# Altium footprint library TinyShuffle v.0.PcbLib: 44 footprints (part 3 of 3)
Each footprint in its own frame and in the unit in brackets; x right, y up, seen from the top. Pads: shape width x height; smd on the part's side, far side on the other; paste and mask are expansions set on the pad; w line width, h text height; cw(c..) or ccw(c..) is an arc to the next point about the centre after c.
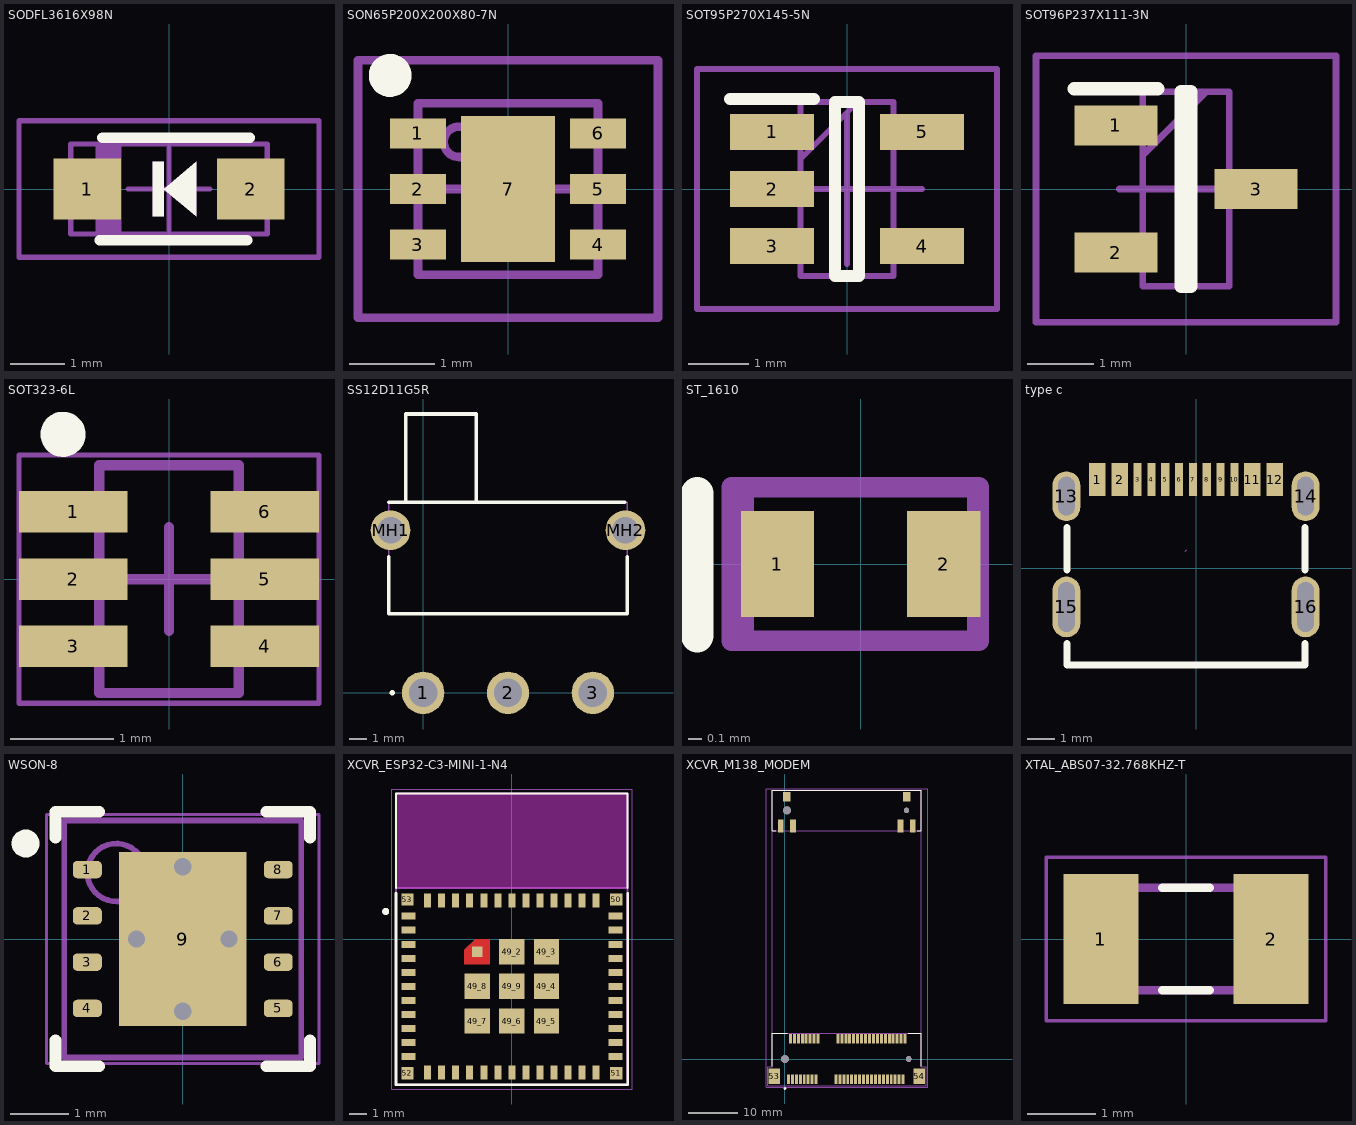
[diagram p2: the footprints below, top view; thin cyan lines are the x and y axes]

## SODFL3616X98N [mm]
pads (2):
  rect 1.24x1.12 smd: 1(-1.5,0) 2(1.5,0)
Top Overlay:
  region: -0.3,0 -0.3,0.5 -0.1,0.5 -0.1,0
  region: -0.1,0 0.5,0.5 0.5,0
  region: -0.3,0 -0.3,-0.5 -0.1,-0.5 -0.1,0
  region: -0.1,0 0.5,-0.5 0.5,0
  lines w0.2: -1.27,-0.94 1.43,-0.94 ; -1.219,0.94 1.481,0.94
Top Component Outline:
  rectangle: -1.35,-0.825 -0.875,0.825
  region: -0.3,0 -0.3,0.5 -0.1,0.5 -0.1,0
  region: -0.1,0 0.5,0.5 0.5,0
  region: -0.3,0 -0.3,-0.5 -0.1,-0.5 -0.1,0
  region: -0.1,0 0.5,-0.5 0.5,0
  lines w0.1: -1.8,-0.825 1.8,-0.825 1.8,0.825 -1.8,0.825 -1.8,-0.825
Top Courtyard:
  lines w0.1: -0.75,0 0,0 ; 0,-0.75 0,0 ; 0,0.75 0,0 ; 0.75,0 0,0 ; -2.75,-1.25 -2.75,1.25 2.75,1.25 2.75,-1.25 0,-1.25 -2.75,-1.25
3D body "NRVB120VLSFT1G.stp": height 0.98, standoff 0, extent -1.8,-0.825 1.8,0.825

## SON65P200X200X80-7N [mm]
pads (7):
  rect 0.65x0.35 smd mask+0.05: 1(-1.05,0.65) 2(-1.05,0) 3(-1.05,-0.65) 4(1.05,-0.65) 5(1.05,0) 6(1.05,0.65)
  rect 1.1x1.7 smd mask+0: 7(0,0)
Top Overlay:
  circle w0.25: c-1.375,1.325 r0.125
Top Component Outline:
  circle w0.1: c-0.573,0.55 r0.177
  lines w0.1: -1.05,-1 1.05,-1 1.05,1 -1.05,1 -1.05,-1
Top Courtyard:
  lines w0.1: -0.75,0 0,0 ; 0,-0.75 0,0 ; 0,0.75 0,0 ; 0.75,0 0,0 ; -1.75,-1.5 0,-1.5 1.75,-1.5 1.75,0 1.75,1.5 0,1.5 -1.75,1.5 -1.75,0 -1.75,-1.5
3D body "NCV8187AMT330TAG.stp": height 0.8, standoff 0, extent -1.05,-1 1.05,1

## SOT95P270X145-5N [mm]
pads (5):
  rect 1.4x0.6 smd paste-0.05: 1(-1.25,0.95) 2(-1.25,0) 3(-1.25,-0.95) 4(1.25,-0.95) 5(1.25,0.95)
Top Overlay:
  lines w0.2: -1.95,1.5 -0.55,1.5 ; -0.2,-1.45 0.2,-1.45 0.2,1.45 -0.2,1.45 -0.2,-1.45
Top Component Outline:
  lines w0.1: -0.775,0.5 0.175,1.45 ; -0.775,-1.45 0.775,-1.45 0.775,1.45 -0.775,1.45 -0.775,-1.45
Top Courtyard:
  lines w0.1: -1.25,0 0,0 ; 0,-1.25 0,0 ; 0,1.25 0,0 ; 1.25,0 0,0 ; -2.5,-2 0,-2 2.5,-2 2.5,0 2.5,2 0,2 -2.5,2 -2.5,0 -2.5,-2
3D body "MCP73831T-2ACI_OT.stp": height 1.45, standoff 0, extent -1.35,-1.45 1.35,1.45

## SOT96P237X111-3N [mm]
pads (3):
  rect 1.25x0.6 smd paste-0.05: 1(-1.05,0.955) 2(-1.05,-0.955) 3(1.05,0)
Top Overlay:
  lines w0.2: -1.675,1.505 -0.425,1.505 ; -0.075,-1.46 0.075,-1.46 0.075,1.46 -0.075,1.46 -0.075,-1.46
Top Component Outline:
  lines w0.1: -0.65,0.505 0.305,1.46 ; -0.65,-1.46 0.65,-1.46 0.65,1.46 -0.65,1.46 -0.65,-1.46
Top Courtyard:
  lines w0.1: -1,0 0,0 ; 0,-1 0,0 ; 0,1 0,0 ; 1,0 0,0 ; -2.25,-2 0,-2 2.25,-2 2.25,0 2.25,2 0,2 -2.25,2 -2.25,0 -2.25,-2
3D body "MMBT2222ALT1G.stp": height 1.11, standoff 0, extent -1.185,-1.46 1.185,1.46

## SOT323-6L [mm] "SOT23, 6-Leads, Body 2,00x2,10mm, Pitch 0,65mm, IPC High Density"
height 1.1
pads (6):
  rect 1.05x0.4 smd paste-0.03 mask+0.05: 1(-0.925,0.65) 2(-0.925,0) 3(-0.925,-0.65) 4(0.925,-0.65) 5(0.925,0) 6(0.925,0.65)
Top Overlay:
  circle w0.25: c-1.025,1.4 r0.093
Mechanical 11:
  lines w0.1: -0.675,-1.1 0.675,-1.1 0.675,1.1 -0.675,1.1 -0.675,-1.1
Top Courtyard:
  lines w0.05: -1.45,-1.2 1.45,-1.2 1.45,1.2 -1.45,1.2 -1.45,-1.2
  lines w0.1: -0.5,0 0.5,0 ; 0,-0.5 0,0.5
3D body: height 1.1, standoff 0.1, extent -0.675,-1.1 0.675,1.1

## SS12D11G5R [mm]
pads (5):
  round 2.4 hole 1.6: 1(0,0) 2(4.8,0) 3(9.6,0)
  round 2.25 hole 1.5: MH1(-1.85,9.2) MH2(11.45,9.2)
Top Overlay:
  lines w0.2: -1.95,7.7 -1.95,4.48 11.55,4.48 11.55,7.7 ; -1.95,10.78 11.4,10.78 ; -1.8,0 ccw(c-1.75,0) -1.7,0 ; -1.8,0 cw(c-1.75,0) -1.7,0 ; -1.8,0 ccw(c-1.75,0) -1.7,0 ; -1,10.78 -1,15.78 3,15.78 3,10.78 -1,10.78
Top Component Outline:
  lines w0.1: -1.95,4.48 -1.95,10.78 11.55,10.78 11.55,4.48 -1.95,4.48

## ST_1610 [mm]
height 0.6
pads (2):
  rect 0.55x0.8 smd paste-0.05 mask+0.05: 1(-0.625,0) 2(0.625,0)
Top Overlay:
  lines w0.25: -1.23,-0.54 -1.23,0.53
Top Assembly:
  lines w0.15: -0.97,-0.58 -0.97,0.58 0.89,0.58 0.89,-0.58 -0.97,-0.58
  text "'.Designator'" at -1.14,0.968 h1
Top Component Outline:
  lines w0.1: -0.85,-0.55 0.85,-0.55 0.85,0.55 -0.85,0.55 -0.85,-0.55
3D body "ZDO_1610_STM.step": height 0.66, standoff 0, extent -0.851,-0.546 0.851,0.546

## type c [mm]
pads (16):
  rect 0.6x1.2 smd: 1(-3.579,3.203) 2(-2.779,3.203) 11(2.021,3.203) 12(2.821,3.203)
  rect 0.3x1.2 smd: 3(-2.129,3.203) 4(-1.629,3.203) 5(-1.129,3.203) 6(-0.629,3.203) 7(-0.129,3.203) 8(0.371,3.203) 9(0.871,3.203) 10(1.371,3.203)
  oval 1x1.8 hole 0.6 slot 1.4 at 90 deg: 13(-4.699,2.603) 14(3.941,2.603)
  oval 1x2.2 hole 0.6 slot 1.8 at 90 deg: 15(-4.699,-1.397) 16(3.941,-1.397)
Top Overlay:
  lines w0.254: -4.679,-2.728 -4.679,-3.497 3.921,-3.497 3.921,-2.728 ; -4.679,-0.066 -4.679,1.472 ; 3.921,-0.066 3.921,1.472
Top Courtyard:
  lines w0.003: -0.404,0.621 -0.354,0.672

## WSON-8 [mm] "SON, 8-Leads, Body 4,00x4,00mm, Pitch 0,80mm, Thermal Pad 2,20x2,29mm, IPC High Density"
height 0.8
pads (9):
  rrect50% 0.5x0.3 smd: 1(-1.65,1.2) 2(-1.65,0.4) 3(-1.65,-0.4) 4(-1.65,-1.2) 5(1.65,-1.2) 6(1.65,-0.4) 7(1.65,0.4) 8(1.65,1.2)
  rect 2.2x3 smd paste-3: 9(0,0)
via -0.8,0 diameter 0.5 hole 0.3
via 0.8,0 diameter 0.5 hole 0.3
via 0,1.25 diameter 0.5 hole 0.3
via 0,-1.25 diameter 0.5 hole 0.3
Top Overlay:
  circle w0.254: c-2.718,1.651 r0.114
  lines w0.2: -2.2,-1.75 -2.2,-2.2 -1.445,-2.2 ; -2.2,1.75 -2.2,2.2 -1.445,2.2 ; 1.445,-2.2 2.2,-2.2 2.2,-1.75 ; 1.445,2.2 2.2,2.2 2.2,1.75
Top Paste:
  rectangle: -1.08,0.1 -0.1,1.41
  rectangle: 0.1,0.1 1.08,1.41
  rectangle: -1.08,-1.41 -0.1,-0.1
  rectangle: 0.1,-1.41 1.08,-0.1
Mechanical 12:
  circle w0.1: c-1.15,1.15 r0.5
  lines w0.1: -2.05,-2.05 -2.05,2.05 2.05,2.05 2.05,-2.05 -2.05,-2.05
Top Courtyard:
  lines w0.05: -2.355,-2.15 -2.355,2.15 2.355,2.15 2.355,-2.15 -2.355,-2.15
  lines w0.1: -0.5,0 0.5,0 ; 0,-0.5 0,0.5
3D body: height 0.8, standoff 0.1, extent -2.05,-2.05 2.05,2.05

## XCVR_ESP32-C3-MINI-1-N4 [mm]
pads (61):
  rect 0.8x0.4 smd: 1(-5.9,1.3) 2(-5.9,0.5) 3(-5.9,-0.3) 4(-5.9,-1.1) 5(-5.9,-1.9) 6(-5.9,-2.7) 7(-5.9,-3.5) 8(-5.9,-4.3) 9(-5.9,-5.1) 10(-5.9,-5.9) 11(-5.9,-6.7) 25(5.9,-6.7) 26(5.9,-5.9) 27(5.9,-5.1) 28(5.9,-4.3) 29(5.9,-3.5) 30(5.9,-2.7) 31(5.9,-1.9) 32(5.9,-1.1) 33(5.9,-0.3) 34(5.9,0.5) 35(5.9,1.3)
  rect 0.4x0.8 smd: 12(-4.8,-7.6) 13(-4,-7.6) 14(-3.2,-7.6) 15(-2.4,-7.6) 16(-1.6,-7.6) 17(-0.8,-7.6) 18(0,-7.6) 19(0.8,-7.6) 20(1.6,-7.6) 21(2.4,-7.6) 22(3.2,-7.6) 23(4,-7.6) 24(4.8,-7.6) 36(4.8,2.2) 37(4,2.2) 38(3.2,2.2) 39(2.4,2.2) 40(1.6,2.2) 41(0.8,2.2) 42(0,2.2) 43(-0.8,2.2) 44(-1.6,2.2) 45(-2.4,2.2) 46(-3.2,2.2) 47(-4,2.2) 48(-4.8,2.2)
  rect 0.6x0.6 smd paste-1 mask+0: 49_1(-1.975,-0.725)
  rect 1.45x1.45 smd: 49_2(0,-0.725) 49_3(1.975,-0.725) 49_4(1.975,-2.7) 49_5(1.975,-4.675) 49_6(0,-4.675) 49_7(-1.975,-4.675) 49_8(-1.975,-2.7) 49_9(0,-2.7)
  rect 0.7x0.7 smd: 50(5.95,2.25) 51(5.95,-7.65) 52(-5.95,-7.65) 53(-5.95,2.25)
Top Layer:
  region: -1.25,-1.45 -2.7,-1.45 -2.7,-0.6 -2.1,0 -1.25,0
Top Overlay:
  circle w0.2: c-7.188,1.575 r0.1
  lines w0.127: -6.6,2.92 -6.6,8.3 6.6,8.3 6.6,2.92
  lines w0.152: -6.6,2.6 -6.6,-8.3 6.6,-8.3 6.6,2.6
Top Paste:
  region: -1.25,-1.45 -2.7,-1.45 -2.7,-0.6 -2.1,0 -1.25,0
Top Solder:
  region: -1.15,-1.55 -2.8,-1.55 -2.8,-0.56 -2.14,0.1 -1.15,0.1
Keep-Out Layer:
  region: 6.6,2.9 -6.6,2.9 -6.6,8.3 6.6,8.3
  region: 6.6,2.9 -6.6,2.9 -6.6,8.3 6.6,8.3
Top Component Outline:
  circle w0.2: c-7.188,1.575 r0.1
  lines w0.127: -6.6,2.9 -6.6,-8.3 6.6,-8.3 6.6,2.9 ; -6.6,2.9 -6.6,8.3 6.6,8.3 6.6,2.9 ; -6.6,2.9 6.6,2.9
Top Courtyard:
  lines w0.05: -6.85,-8.55 -6.85,8.55 6.85,8.55 6.85,-8.55 -6.85,-8.55
3D body "step_temp.STEP": height 2.55, standoff 0, extent -6.6,-8.3 6.6,8.3

## XCVR_M138_MODEM [mm]
pads (64):
  rect 0.6x2 smd: 1(0.7,-4.1) 2(1.1,4.1) 3(1.5,-4.1) 4(1.9,4.1) 5(2.3,-4.1) 6(2.7,4.1) 7(3.1,-4.1) 8(3.5,4.1) 9(3.9,-4.1) 10(4.3,4.1) 11(4.7,-4.1) 12(5.1,4.1) 13(5.5,-4.1) 14(5.9,4.1) 15(6.3,-4.1) 16(6.7,4.1) 17(10.3,-4.1) 18(10.7,4.1) 19(11.1,-4.1) 20(11.5,4.1) 21(11.9,-4.1) 22(12.3,4.1) 23(12.7,-4.1) 24(13.1,4.1) 25(13.5,-4.1) 26(13.9,4.1) 27(14.3,-4.1) 28(14.7,4.1) 29(15.1,-4.1) 30(15.5,4.1) 31(15.9,-4.1) 32(16.3,4.1) 33(16.7,-4.1) 34(17.1,4.1) 35(17.5,-4.1) 36(17.9,4.1) 37(18.3,-4.1) 38(18.7,4.1) 39(19.1,-4.1) 40(19.5,4.1) 41(19.9,-4.1) 42(20.3,4.1) 43(20.7,-4.1) 44(21.1,4.1) 45(21.5,-4.1) 46(21.9,4.1) 47(22.3,-4.1) 48(22.7,4.1) 49(23.1,-4.1) 50(23.5,4.1) 51(23.9,-4.1) 52(24.3,4.1)
  rect 2.3x3.2 smd: 53(-2.15,-3.5) 54(27.15,-3.5)
  rect 1.5x1.9 smd: S1_1(0.4,53.05) S2_1(24.6,53.05)
  rect 1.2x2.7 smd: S1_2(-0.85,47.15) S1_3(1.65,47.15) S2_2(23.35,47.15) S2_3(25.85,47.15)
  round 1.63 hole 1.63 unplated: ""(0,0)
  round 1.58 hole 1.58 unplated: ""(0.4,50.3)
  round 1.08 hole 1.08 unplated: ""(24.6,50.3)
  round 1.13 hole 1.13 unplated: ""(25,0)
Top Overlay:
  circle w0.4: c0,-5.969 r0.073
  lines w0.127: -2.54,-1.503 -2.54,5.227 0.463,5.227 ; -1.882,46.139 -2.54,46.139 -2.54,54.371 27.61,54.371 27.61,46.139 26.78,46.139 ; 24.937,5.227 27.61,5.227 27.61,-1.503
Top Solder:
  rectangle: 0.305,-5.207 6.706,-2.997
  rectangle: 0.686,3.023 7.087,5.232
  rectangle: 10.363,3.023 24.778,5.232
  rectangle: 9.918,-5.232 24.333,-2.997
Top Component Outline:
  circle w0.2: c0,-5.969 r0.1
  lines w0.127: -2.54,5.227 -2.54,46.139 ; -2.54,5.227 -2.54,-1.524 -3.505,-1.524 -3.505,-5.461 28.6,-5.461 28.6,-1.524 27.61,-1.524 27.61,5.227 ; -2.54,5.227 27.61,5.227 ; -2.54,46.139 -2.54,54.371 27.61,54.371 27.61,46.139 ; -2.54,46.139 27.61,46.139 ; 27.61,5.227 27.61,46.139
Top Courtyard:
  lines w0.05: -3.755,-5.711 -3.755,54.621 28.85,54.621 28.85,-5.711 -3.755,-5.711
3D body "TILE-LB_102120211208.step": height 6.9, standoff 1.77, extent -2.357,0.169 27.643,51.119
3D body "K3D-MM60-52B1-B1-R2 JAE Connector Division Proprietary.STEP": height 3.9, standoff -0.8, extent -2.404,-4.873 27.296,5.127
3D body "K3D-MM60-EZH039-B5-R2 JAE Connector Division Proprietary.STEP": height 4.8, standoff -0.8, extent -1.985,46.418 27.015,54.318

## XTAL_ABS07-32.768KHZ-T [mm]
pads (2):
  rect 1.1x1.9 smd paste-0.03: 1(-1.25,0) 2(1.25,0)
Top Overlay:
  lines w0.127: -0.35,-0.75 0.35,-0.75 ; -0.35,0.75 0.35,0.75
Top Component Outline:
  lines w0.127: -1.6,-0.75 1.6,-0.75 1.6,0.75 -1.6,0.75 -1.6,-0.75
Top Courtyard:
  lines w0.05: -2.05,-1.2 2.05,-1.2 2.05,1.2 -2.05,1.2 -2.05,-1.2
3D body "ABS07-32.768KHZ-T--3DModel-STEP-400430.STEP": height 0.89, standoff 0, extent -1.6,-0.749 1.6,0.749